# Altium footprint library PcbLib.PcbLib: 13 footprints
Each footprint in its own frame and in the unit in brackets; x right, y up, seen from the top. Pads: shape width x height; smd on the part's side, far side on the other; paste and mask are expansions set on the pad; w line width, h text height; cw(c..) or ccw(c..) is an arc to the next point about the centre after c.
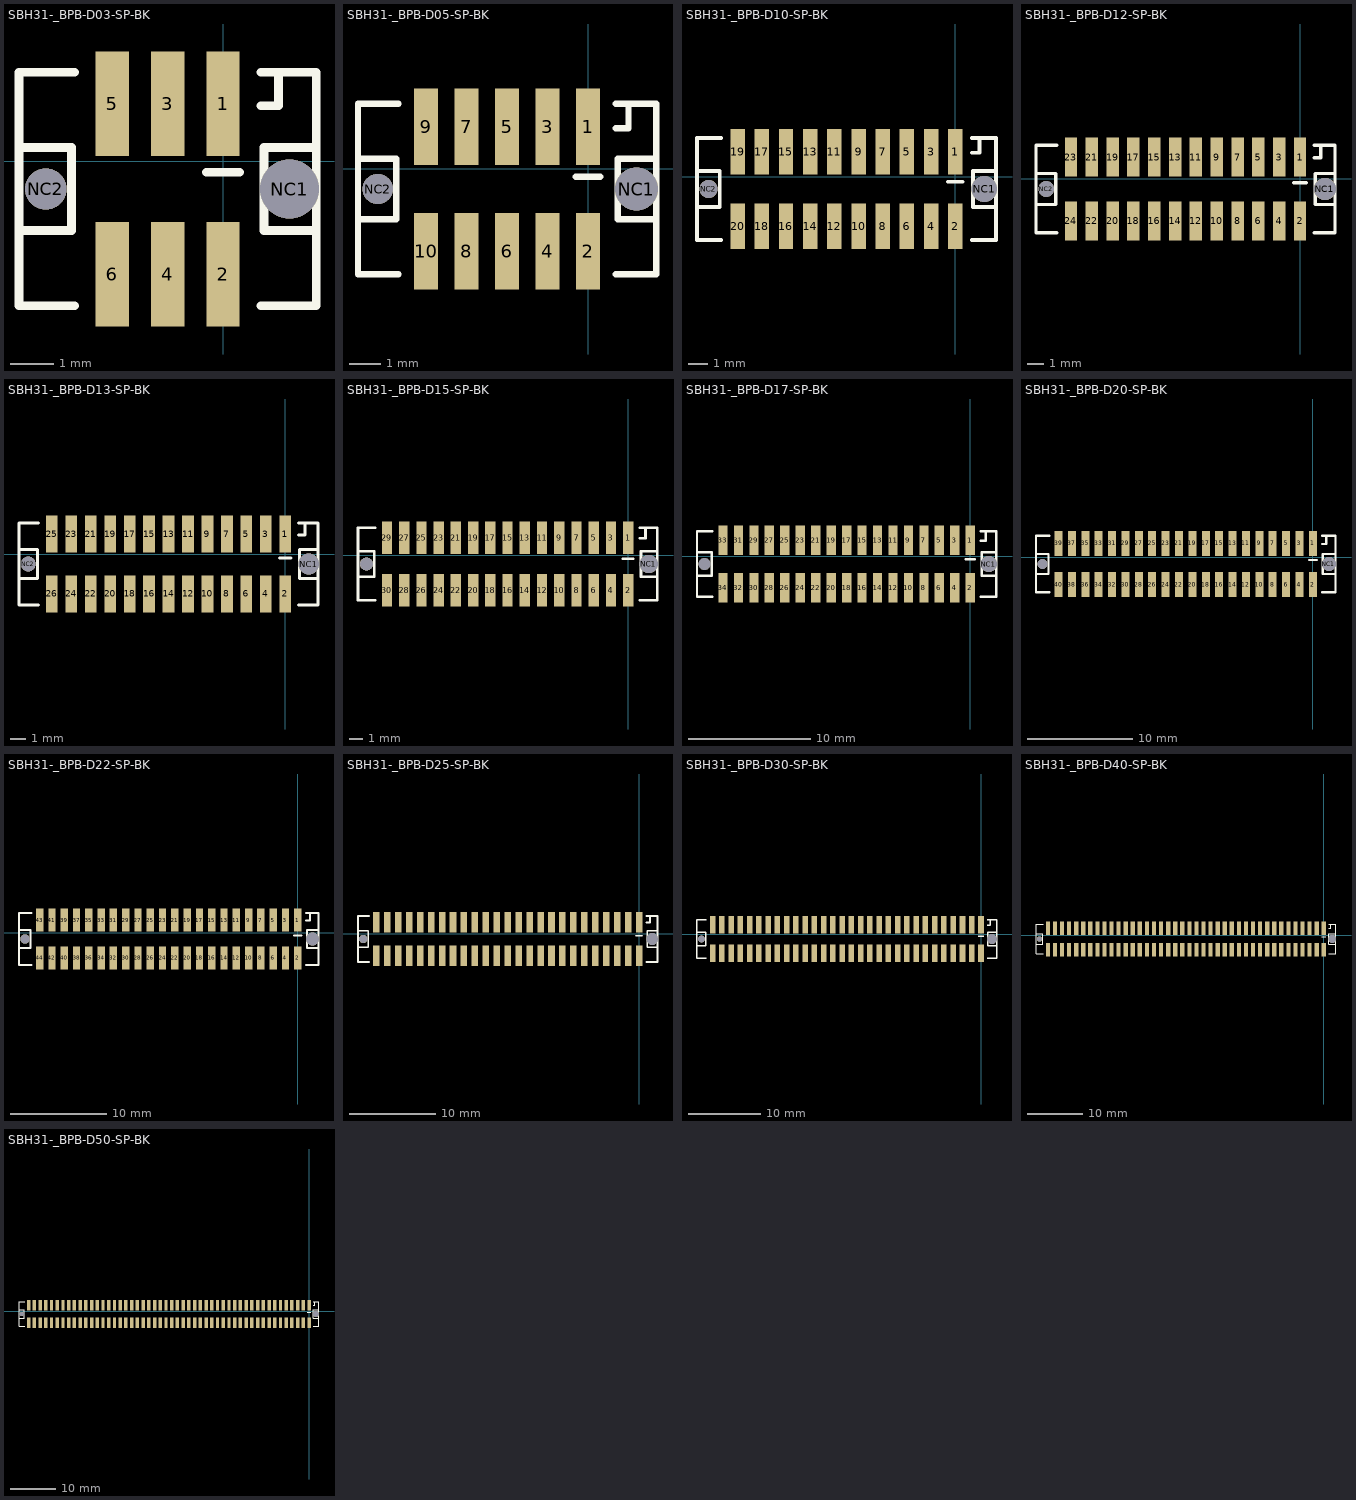
[diagram p0: the footprints below, top view; thin cyan lines are the x and y axes]

## SBH31-_BPB-D03-SP-BK [mm] "1.27mm SMT Male Header with Guide Posts & Polarizing Key"
height 5.6
pads (8):
  rect 0.76x2.4 smd: 1(0,1.315) 2(0,-2.585) 3(-1.27,1.315) 4(-1.27,-2.585) 5(-2.54,1.315) 6(-2.54,-2.585)
  round 1.35 hole 1.35 mask+0: NC1(1.52,-0.635)
  round 0.95 hole 0.95 mask+0: NC2(-4.06,-0.635)
via 1.52,-0.635 diameter 1.35 hole 1.35
via -4.06,-0.635 diameter 0.95 hole 0.95
Top Overlay:
  lines w0.2: -4.675,-1.585 -3.475,-1.585 -3.475,0.315 -4.675,0.315 ; -3.405,-3.31 -4.675,-3.31 -4.675,2.04 -3.405,2.04 ; -0.381,-0.254 0.381,-0.254 ; 0.865,-3.31 2.135,-3.31 2.135,2.04 0.865,2.04 ; 0.865,1.27 1.27,1.27 1.27,2.04 ; 2.135,-1.585 0.935,-1.585 0.935,0.315 2.135,0.315
3D body "SBH31-_ _ _B-D03-SP-_ _.STEP": height 5.54, standoff -0.85, extent -4.675,-3.385 2.135,2.115

## SBH31-_BPB-D05-SP-BK [mm] "1.27mm SMT Male Header with Guide Posts & Polarizing Key"
height 5.6
pads (12):
  rect 0.76x2.4 smd: 1(0,1.315) 2(0,-2.585) 3(-1.27,1.315) 4(-1.27,-2.585) 5(-2.54,1.315) 6(-2.54,-2.585) 7(-3.81,1.315) 8(-3.81,-2.585) 9(-5.08,1.315) 10(-5.08,-2.585)
  round 1.35 hole 1.35 mask+0: NC1(1.52,-0.635)
  round 0.95 hole 0.95 mask+0: NC2(-6.6,-0.635)
via -6.6,-0.635 diameter 0.95 hole 0.95
via 1.52,-0.635 diameter 1.35 hole 1.35
Top Overlay:
  lines w0.2: -7.215,-1.585 -6.015,-1.585 -6.015,0.315 -7.215,0.315 ; -5.945,-3.31 -7.215,-3.31 -7.215,2.04 -5.945,2.04 ; -0.381,-0.254 0.381,-0.254 ; 0.865,-3.31 2.135,-3.31 2.135,2.04 0.865,2.04 ; 0.865,1.27 1.27,1.27 1.27,2.04 ; 2.135,-1.585 0.935,-1.585 0.935,0.315 2.135,0.315

## SBH31-_BPB-D10-SP-BK [mm] "1.27mm SMT Male Header with Guide Posts & Polarizing Key"
height 5.6
pads (22):
  rect 0.76x2.4 smd: 1(0,1.315) 2(0,-2.585) 3(-1.27,1.315) 4(-1.27,-2.585) 5(-2.54,1.315) 6(-2.54,-2.585) 7(-3.81,1.315) 8(-3.81,-2.585) 9(-5.08,1.315) 10(-5.08,-2.585) 11(-6.35,1.315) 12(-6.35,-2.585) 13(-7.62,1.315) 14(-7.62,-2.585) 15(-8.89,1.315) 16(-8.89,-2.585) 17(-10.16,1.315) 18(-10.16,-2.585) 19(-11.43,1.315) 20(-11.43,-2.585)
  round 1.35 hole 1.35 mask+0: NC1(1.52,-0.635)
  round 0.95 hole 0.95 mask+0: NC2(-12.95,-0.635)
via 1.52,-0.635 diameter 1.35 hole 1.35
via -12.95,-0.635 diameter 0.95 hole 0.95
Top Overlay:
  lines w0.2: -13.565,-1.585 -12.365,-1.585 -12.365,0.315 -13.565,0.315 ; -12.295,-3.31 -13.565,-3.31 -13.565,2.04 -12.295,2.04 ; -0.381,-0.254 0.381,-0.254 ; 0.865,-3.31 2.135,-3.31 2.135,2.04 0.865,2.04 ; 0.865,1.27 1.27,1.27 1.27,2.04 ; 2.135,-1.585 0.935,-1.585 0.935,0.315 2.135,0.315

## SBH31-_BPB-D12-SP-BK [mm] "1.27mm SMT Male Header with Guide Posts & Polarizing Key"
height 5.6
pads (26):
  rect 0.76x2.4 smd: 1(0,1.315) 2(0,-2.585) 3(-1.27,1.315) 4(-1.27,-2.585) 5(-2.54,1.315) 6(-2.54,-2.585) 7(-3.81,1.315) 8(-3.81,-2.585) 9(-5.08,1.315) 10(-5.08,-2.585) 11(-6.35,1.315) 12(-6.35,-2.585) 13(-7.62,1.315) 14(-7.62,-2.585) 15(-8.89,1.315) 16(-8.89,-2.585) 17(-10.16,1.315) 18(-10.16,-2.585) 19(-11.43,1.315) 20(-11.43,-2.585) 21(-12.7,1.315) 22(-12.7,-2.585) 23(-13.97,1.315) 24(-13.97,-2.585)
  round 1.35 hole 1.35 mask+0: NC1(1.52,-0.635)
  round 0.95 hole 0.95 mask+0: NC2(-15.49,-0.635)
via 1.52,-0.635 diameter 1.35 hole 1.35
via -15.49,-0.635 diameter 0.95 hole 0.95
Top Overlay:
  lines w0.2: -16.105,-1.585 -14.905,-1.585 -14.905,0.315 -16.105,0.315 ; -14.835,-3.31 -16.105,-3.31 -16.105,2.04 -14.835,2.04 ; -0.381,-0.254 0.381,-0.254 ; 0.865,-3.31 2.135,-3.31 2.135,2.04 0.865,2.04 ; 0.865,1.27 1.27,1.27 1.27,2.04 ; 2.135,-1.585 0.935,-1.585 0.935,0.315 2.135,0.315

## SBH31-_BPB-D13-SP-BK [mm] "1.27mm SMT Male Header with Guide Posts & Polarizing Key"
height 5.6
pads (28):
  rect 0.76x2.4 smd: 1(0,1.315) 2(0,-2.585) 3(-1.27,1.315) 4(-1.27,-2.585) 5(-2.54,1.315) 6(-2.54,-2.585) 7(-3.81,1.315) 8(-3.81,-2.585) 9(-5.08,1.315) 10(-5.08,-2.585) 11(-6.35,1.315) 12(-6.35,-2.585) 13(-7.62,1.315) 14(-7.62,-2.585) 15(-8.89,1.315) 16(-8.89,-2.585) 17(-10.16,1.315) 18(-10.16,-2.585) 19(-11.43,1.315) 20(-11.43,-2.585) 21(-12.7,1.315) 22(-12.7,-2.585) 23(-13.97,1.315) 24(-13.97,-2.585) 25(-15.24,1.315) 26(-15.24,-2.585)
  round 1.35 hole 1.35 mask+0: NC1(1.52,-0.635)
  round 0.95 hole 0.95 mask+0: NC2(-16.76,-0.635)
via 1.52,-0.635 diameter 1.35 hole 1.35
via -16.76,-0.635 diameter 0.95 hole 0.95
Top Overlay:
  lines w0.2: -17.375,-1.585 -16.175,-1.585 -16.175,0.315 -17.375,0.315 ; -16.105,-3.31 -17.375,-3.31 -17.375,2.04 -16.105,2.04 ; -0.381,-0.254 0.381,-0.254 ; 0.865,-3.31 2.135,-3.31 2.135,2.04 0.865,2.04 ; 0.865,1.27 1.27,1.27 1.27,2.04 ; 2.135,-1.585 0.935,-1.585 0.935,0.315 2.135,0.315
3D body "SBH31-_ _ _B-D13-SP-_ _.STEP": height 5.54, standoff -0.86, extent -17.375,-3.385 2.135,2.115

## SBH31-_BPB-D15-SP-BK [mm] "1.27mm SMT Male Header with Guide Posts & Polarizing Key"
height 5.6
pads (32):
  rect 0.76x2.4 smd: 1(0,1.315) 2(0,-2.585) 3(-1.27,1.315) 4(-1.27,-2.585) 5(-2.54,1.315) 6(-2.54,-2.585) 7(-3.81,1.315) 8(-3.81,-2.585) 9(-5.08,1.315) 10(-5.08,-2.585) 11(-6.35,1.315) 12(-6.35,-2.585) 13(-7.62,1.315) 14(-7.62,-2.585) 15(-8.89,1.315) 16(-8.89,-2.585) 17(-10.16,1.315) 18(-10.16,-2.585) 19(-11.43,1.315) 20(-11.43,-2.585) 21(-12.7,1.315) 22(-12.7,-2.585) 23(-13.97,1.315) 24(-13.97,-2.585) 25(-15.24,1.315) 26(-15.24,-2.585) 27(-16.51,1.315) 28(-16.51,-2.585) 29(-17.78,1.315) 30(-17.78,-2.585)
  round 1.35 hole 1.35 mask+0: NC1(1.52,-0.635)
  round 0.95 hole 0.95 mask+0: NC2(-19.3,-0.635)
via 1.52,-0.635 diameter 1.35 hole 1.35
via -19.3,-0.635 diameter 0.95 hole 0.95
Top Overlay:
  lines w0.2: -19.915,-1.585 -18.715,-1.585 -18.715,0.315 -19.915,0.315 ; -18.645,-3.31 -19.915,-3.31 -19.915,2.04 -18.645,2.04 ; -0.381,-0.254 0.381,-0.254 ; 0.865,-3.31 2.135,-3.31 2.135,2.04 0.865,2.04 ; 0.865,1.27 1.27,1.27 1.27,2.04 ; 2.135,-1.585 0.935,-1.585 0.935,0.315 2.135,0.315

## SBH31-_BPB-D17-SP-BK [mm] "1.27mm SMT Male Header with Guide Posts & Polarizing Key"
height 5.6
pads (36):
  rect 0.76x2.4 smd: 1(0,1.315) 2(0,-2.585) 3(-1.27,1.315) 4(-1.27,-2.585) 5(-2.54,1.315) 6(-2.54,-2.585) 7(-3.81,1.315) 8(-3.81,-2.585) 9(-5.08,1.315) 10(-5.08,-2.585) 11(-6.35,1.315) 12(-6.35,-2.585) 13(-7.62,1.315) 14(-7.62,-2.585) 15(-8.89,1.315) 16(-8.89,-2.585) 17(-10.16,1.315) 18(-10.16,-2.585) 19(-11.43,1.315) 20(-11.43,-2.585) 21(-12.7,1.315) 22(-12.7,-2.585) 23(-13.97,1.315) 24(-13.97,-2.585) 25(-15.24,1.315) 26(-15.24,-2.585) 27(-16.51,1.315) 28(-16.51,-2.585) 29(-17.78,1.315) 30(-17.78,-2.585) 31(-19.05,1.315) 32(-19.05,-2.585) 33(-20.32,1.315) 34(-20.32,-2.585)
  round 1.35 hole 1.35 mask+0: NC1(1.52,-0.635)
  round 0.95 hole 0.95 mask+0: NC2(-21.84,-0.635)
via -21.84,-0.635 diameter 0.95 hole 0.95
via 1.52,-0.635 diameter 1.35 hole 1.35
Top Overlay:
  lines w0.2: -22.455,-1.585 -21.255,-1.585 -21.255,0.315 -22.455,0.315 ; -21.185,-3.31 -22.455,-3.31 -22.455,2.04 -21.185,2.04 ; -0.381,-0.254 0.381,-0.254 ; 0.865,-3.31 2.135,-3.31 2.135,2.04 0.865,2.04 ; 0.865,1.27 1.27,1.27 1.27,2.04 ; 2.135,-1.585 0.935,-1.585 0.935,0.315 2.135,0.315
3D body "SBH31-_ _ _B-D17-SP-_ _.STEP": height 5.54, standoff -0.86, extent -22.455,-3.385 2.135,2.115

## SBH31-_BPB-D20-SP-BK [mm] "1.27mm SMT Male Header with Guide Posts & Polarizing Key"
height 5.6
pads (42):
  rect 0.76x2.4 smd: 1(0,1.315) 2(0,-2.585) 3(-1.27,1.315) 4(-1.27,-2.585) 5(-2.54,1.315) 6(-2.54,-2.585) 7(-3.81,1.315) 8(-3.81,-2.585) 9(-5.08,1.315) 10(-5.08,-2.585) 11(-6.35,1.315) 12(-6.35,-2.585) 13(-7.62,1.315) 14(-7.62,-2.585) 15(-8.89,1.315) 16(-8.89,-2.585) 17(-10.16,1.315) 18(-10.16,-2.585) 19(-11.43,1.315) 20(-11.43,-2.585) 21(-12.7,1.315) 22(-12.7,-2.585) 23(-13.97,1.315) 24(-13.97,-2.585) 25(-15.24,1.315) 26(-15.24,-2.585) 27(-16.51,1.315) 28(-16.51,-2.585) 29(-17.78,1.315) 30(-17.78,-2.585) 31(-19.05,1.315) 32(-19.05,-2.585) 33(-20.32,1.315) 34(-20.32,-2.585) 35(-21.59,1.315) 36(-21.59,-2.585) 37(-22.86,1.315) 38(-22.86,-2.585) 39(-24.13,1.315) 40(-24.13,-2.585)
  round 1.35 hole 1.35 mask+0: NC1(1.52,-0.635)
  round 0.95 hole 0.95 mask+0: NC2(-25.65,-0.635)
via 1.52,-0.635 diameter 1.35 hole 1.35
via -25.65,-0.635 diameter 0.95 hole 0.95
Top Overlay:
  lines w0.2: -26.265,-1.585 -25.065,-1.585 -25.065,0.315 -26.265,0.315 ; -24.995,-3.31 -26.265,-3.31 -26.265,2.04 -24.995,2.04 ; -0.381,-0.254 0.381,-0.254 ; 0.865,-3.31 2.135,-3.31 2.135,2.04 0.865,2.04 ; 0.865,1.27 1.27,1.27 1.27,2.04 ; 2.135,-1.585 0.935,-1.585 0.935,0.315 2.135,0.315

## SBH31-_BPB-D22-SP-BK [mm] "1.27mm SMT Male Header with Guide Posts & Polarizing Key"
height 5.6
pads (46):
  rect 0.76x2.4 smd: 1(0,1.315) 2(0,-2.585) 3(-1.27,1.315) 4(-1.27,-2.585) 5(-2.54,1.315) 6(-2.54,-2.585) 7(-3.81,1.315) 8(-3.81,-2.585) 9(-5.08,1.315) 10(-5.08,-2.585) 11(-6.35,1.315) 12(-6.35,-2.585) 13(-7.62,1.315) 14(-7.62,-2.585) 15(-8.89,1.315) 16(-8.89,-2.585) 17(-10.16,1.315) 18(-10.16,-2.585) 19(-11.43,1.315) 20(-11.43,-2.585) 21(-12.7,1.315) 22(-12.7,-2.585) 23(-13.97,1.315) 24(-13.97,-2.585) 25(-15.24,1.315) 26(-15.24,-2.585) 27(-16.51,1.315) 28(-16.51,-2.585) 29(-17.78,1.315) 30(-17.78,-2.585) 31(-19.05,1.315) 32(-19.05,-2.585) 33(-20.32,1.315) 34(-20.32,-2.585) 35(-21.59,1.315) 36(-21.59,-2.585) 37(-22.86,1.315) 38(-22.86,-2.585) 39(-24.13,1.315) 40(-24.13,-2.585) 41(-25.4,1.315) 42(-25.4,-2.585) 43(-26.67,1.315) 44(-26.67,-2.585)
  round 1.35 hole 1.35 mask+0: NC1(1.52,-0.635)
  round 0.95 hole 0.95 mask+0: NC2(-28.19,-0.635)
via 1.52,-0.635 diameter 1.35 hole 1.35
via -28.19,-0.635 diameter 0.95 hole 0.95
Top Overlay:
  lines w0.2: -28.805,-1.585 -27.605,-1.585 -27.605,0.315 -28.805,0.315 ; -27.535,-3.31 -28.805,-3.31 -28.805,2.04 -27.535,2.04 ; -0.381,-0.254 0.381,-0.254 ; 0.865,-3.31 2.135,-3.31 2.135,2.04 0.865,2.04 ; 0.865,1.27 1.27,1.27 1.27,2.04 ; 2.135,-1.585 0.935,-1.585 0.935,0.315 2.135,0.315

## SBH31-_BPB-D25-SP-BK [mm] "1.27mm SMT Male Header with Guide Posts & Polarizing Key"
height 5.6
pads (52):
  rect 0.76x2.4 smd: 1(0,1.315) 2(0,-2.585) 3(-1.27,1.315) 4(-1.27,-2.585) 5(-2.54,1.315) 6(-2.54,-2.585) 7(-3.81,1.315) 8(-3.81,-2.585) 9(-5.08,1.315) 10(-5.08,-2.585) 11(-6.35,1.315) 12(-6.35,-2.585) 13(-7.62,1.315) 14(-7.62,-2.585) 15(-8.89,1.315) 16(-8.89,-2.585) 17(-10.16,1.315) 18(-10.16,-2.585) 19(-11.43,1.315) 20(-11.43,-2.585) 21(-12.7,1.315) 22(-12.7,-2.585) 23(-13.97,1.315) 24(-13.97,-2.585) 25(-15.24,1.315) 26(-15.24,-2.585) 27(-16.51,1.315) 28(-16.51,-2.585) 29(-17.78,1.315) 30(-17.78,-2.585) 31(-19.05,1.315) 32(-19.05,-2.585) 33(-20.32,1.315) 34(-20.32,-2.585) 35(-21.59,1.315) 36(-21.59,-2.585) 37(-22.86,1.315) 38(-22.86,-2.585) 39(-24.13,1.315) 40(-24.13,-2.585) 41(-25.4,1.315) 42(-25.4,-2.585) 43(-26.67,1.315) 44(-26.67,-2.585) 45(-27.94,1.315) 46(-27.94,-2.585) 47(-29.21,1.315) 48(-29.21,-2.585) 49(-30.48,1.315) 50(-30.48,-2.585)
  round 1.35 hole 1.35 mask+0: NC1(1.52,-0.635)
  round 0.95 hole 0.95 mask+0: NC2(-32,-0.635)
via 1.52,-0.635 diameter 1.35 hole 1.35
via -32,-0.635 diameter 0.95 hole 0.95
Top Overlay:
  lines w0.2: -32.615,-1.585 -31.415,-1.585 -31.415,0.315 -32.615,0.315 ; -31.345,-3.31 -32.615,-3.31 -32.615,2.04 -31.345,2.04 ; -0.381,-0.254 0.381,-0.254 ; 0.865,-3.31 2.135,-3.31 2.135,2.04 0.865,2.04 ; 0.865,1.27 1.27,1.27 1.27,2.04 ; 2.135,-1.585 0.935,-1.585 0.935,0.315 2.135,0.315

## SBH31-_BPB-D30-SP-BK [mm] "1.27mm SMT Male Header with Guide Posts & Polarizing Key"
height 5.6
pads (62):
  rect 0.76x2.4 smd: 1(0,1.315) 2(0,-2.585) 3(-1.27,1.315) 4(-1.27,-2.585) 5(-2.54,1.315) 6(-2.54,-2.585) 7(-3.81,1.315) 8(-3.81,-2.585) 9(-5.08,1.315) 10(-5.08,-2.585) 11(-6.35,1.315) 12(-6.35,-2.585) 13(-7.62,1.315) 14(-7.62,-2.585) 15(-8.89,1.315) 16(-8.89,-2.585) 17(-10.16,1.315) 18(-10.16,-2.585) 19(-11.43,1.315) 20(-11.43,-2.585) 21(-12.7,1.315) 22(-12.7,-2.585) 23(-13.97,1.315) 24(-13.97,-2.585) 25(-15.24,1.315) 26(-15.24,-2.585) 27(-16.51,1.315) 28(-16.51,-2.585) 29(-17.78,1.315) 30(-17.78,-2.585) 31(-19.05,1.315) 32(-19.05,-2.585) 33(-20.32,1.315) 34(-20.32,-2.585) 35(-21.59,1.315) 36(-21.59,-2.585) 37(-22.86,1.315) 38(-22.86,-2.585) 39(-24.13,1.315) 40(-24.13,-2.585) 41(-25.4,1.315) 42(-25.4,-2.585) 43(-26.67,1.315) 44(-26.67,-2.585) 45(-27.94,1.315) 46(-27.94,-2.585) 47(-29.21,1.315) 48(-29.21,-2.585) 49(-30.48,1.315) 50(-30.48,-2.585) 51(-31.75,1.315) 52(-31.75,-2.585) 53(-33.02,1.315) 54(-33.02,-2.585) 55(-34.29,1.315) 56(-34.29,-2.585) 57(-35.56,1.315) 58(-35.56,-2.585) 59(-36.83,1.315) 60(-36.83,-2.585)
  round 1.35 hole 1.35 mask+0: NC1(1.52,-0.635)
  round 0.95 hole 0.95 mask+0: NC2(-38.35,-0.635)
via 1.52,-0.635 diameter 1.35 hole 1.35
via -38.35,-0.635 diameter 0.95 hole 0.95
Top Overlay:
  lines w0.2: -38.965,-1.585 -37.765,-1.585 -37.765,0.315 -38.965,0.315 ; -37.695,-3.31 -38.965,-3.31 -38.965,2.04 -37.695,2.04 ; -0.381,-0.254 0.381,-0.254 ; 0.865,-3.31 2.135,-3.31 2.135,2.04 0.865,2.04 ; 0.865,1.27 1.27,1.27 1.27,2.04 ; 2.135,-1.585 0.935,-1.585 0.935,0.315 2.135,0.315

## SBH31-_BPB-D40-SP-BK [mm] "1.27mm SMT Male Header with Guide Posts & Polarizing Key"
height 5.6
pads (82):
  rect 0.76x2.4 smd: 1(0,1.315) 2(0,-2.585) 3(-1.27,1.315) 4(-1.27,-2.585) 5(-2.54,1.315) 6(-2.54,-2.585) 7(-3.81,1.315) 8(-3.81,-2.585) 9(-5.08,1.315) 10(-5.08,-2.585) 11(-6.35,1.315) 12(-6.35,-2.585) 13(-7.62,1.315) 14(-7.62,-2.585) 15(-8.89,1.315) 16(-8.89,-2.585) 17(-10.16,1.315) 18(-10.16,-2.585) 19(-11.43,1.315) 20(-11.43,-2.585) 21(-12.7,1.315) 22(-12.7,-2.585) 23(-13.97,1.315) 24(-13.97,-2.585) 25(-15.24,1.315) 26(-15.24,-2.585) 27(-16.51,1.315) 28(-16.51,-2.585) 29(-17.78,1.315) 30(-17.78,-2.585) 31(-19.05,1.315) 32(-19.05,-2.585) 33(-20.32,1.315) 34(-20.32,-2.585) 35(-21.59,1.315) 36(-21.59,-2.585) 37(-22.86,1.315) 38(-22.86,-2.585) 39(-24.13,1.315) 40(-24.13,-2.585) 41(-25.4,1.315) 42(-25.4,-2.585) 43(-26.67,1.315) 44(-26.67,-2.585) 45(-27.94,1.315) 46(-27.94,-2.585) 47(-29.21,1.315) 48(-29.21,-2.585) 49(-30.48,1.315) 50(-30.48,-2.585) 51(-31.75,1.315) 52(-31.75,-2.585) 53(-33.02,1.315) 54(-33.02,-2.585) 55(-34.29,1.315) 56(-34.29,-2.585) 57(-35.56,1.315) 58(-35.56,-2.585) 59(-36.83,1.315) 60(-36.83,-2.585) 61(-38.1,1.315) 62(-38.1,-2.585) 63(-39.37,1.315) 64(-39.37,-2.585) 65(-40.64,1.315) 66(-40.64,-2.585) 67(-41.91,1.315) 68(-41.91,-2.585) 69(-43.18,1.315) 70(-43.18,-2.585) 71(-44.45,1.315) 72(-44.45,-2.585) 73(-45.72,1.315) 74(-45.72,-2.585) 75(-46.99,1.315) 76(-46.99,-2.585) 77(-48.26,1.315) 78(-48.26,-2.585) 79(-49.53,1.315) 80(-49.53,-2.585)
  round 1.35 hole 1.35 mask+0: NC1(1.52,-0.635)
  round 0.95 hole 0.95 mask+0: NC2(-51.05,-0.635)
via 1.52,-0.635 diameter 1.35 hole 1.35
via -51.05,-0.635 diameter 0.95 hole 0.95
Top Overlay:
  lines w0.2: -51.665,-1.585 -50.465,-1.585 -50.465,0.315 -51.665,0.315 ; -50.395,-3.31 -51.665,-3.31 -51.665,2.04 -50.395,2.04 ; -0.381,-0.254 0.381,-0.254 ; 0.865,-3.31 2.135,-3.31 2.135,2.04 0.865,2.04 ; 0.865,1.27 1.27,1.27 1.27,2.04 ; 2.135,-1.585 0.935,-1.585 0.935,0.315 2.135,0.315

## SBH31-_BPB-D50-SP-BK [mm] "1.27mm SMT Male Header with Guide Posts & Polarizing Key"
height 5.6
pads (102):
  rect 0.76x2.4 smd: 1(0,1.315) 2(0,-2.585) 3(-1.27,1.315) 4(-1.27,-2.585) 5(-2.54,1.315) 6(-2.54,-2.585) 7(-3.81,1.315) 8(-3.81,-2.585) 9(-5.08,1.315) 10(-5.08,-2.585) 11(-6.35,1.315) 12(-6.35,-2.585) 13(-7.62,1.315) 14(-7.62,-2.585) 15(-8.89,1.315) 16(-8.89,-2.585) 17(-10.16,1.315) 18(-10.16,-2.585) 19(-11.43,1.315) 20(-11.43,-2.585) 21(-12.7,1.315) 22(-12.7,-2.585) 23(-13.97,1.315) 24(-13.97,-2.585) 25(-15.24,1.315) 26(-15.24,-2.585) 27(-16.51,1.315) 28(-16.51,-2.585) 29(-17.78,1.315) 30(-17.78,-2.585) 31(-19.05,1.315) 32(-19.05,-2.585) 33(-20.32,1.315) 34(-20.32,-2.585) 35(-21.59,1.315) 36(-21.59,-2.585) 37(-22.86,1.315) 38(-22.86,-2.585) 39(-24.13,1.315) 40(-24.13,-2.585) 41(-25.4,1.315) 42(-25.4,-2.585) 43(-26.67,1.315) 44(-26.67,-2.585) 45(-27.94,1.315) 46(-27.94,-2.585) 47(-29.21,1.315) 48(-29.21,-2.585) 49(-30.48,1.315) 50(-30.48,-2.585) 51(-31.75,1.315) 52(-31.75,-2.585) 53(-33.02,1.315) 54(-33.02,-2.585) 55(-34.29,1.315) 56(-34.29,-2.585) 57(-35.56,1.315) 58(-35.56,-2.585) 59(-36.83,1.315) 60(-36.83,-2.585) 61(-38.1,1.315) 62(-38.1,-2.585) 63(-39.37,1.315) 64(-39.37,-2.585) 65(-40.64,1.315) 66(-40.64,-2.585) 67(-41.91,1.315) 68(-41.91,-2.585) 69(-43.18,1.315) 70(-43.18,-2.585) 71(-44.45,1.315) 72(-44.45,-2.585) 73(-45.72,1.315) 74(-45.72,-2.585) 75(-46.99,1.315) 76(-46.99,-2.585) 77(-48.26,1.315) 78(-48.26,-2.585) 79(-49.53,1.315) 80(-49.53,-2.585) 81(-50.8,1.315) 82(-50.8,-2.585) 83(-52.07,1.315) 84(-52.07,-2.585) 85(-53.34,1.315) 86(-53.34,-2.585) 87(-54.61,1.315) 88(-54.61,-2.585) 89(-55.88,1.315) 90(-55.88,-2.585) 91(-57.15,1.315) 92(-57.15,-2.585) 93(-58.42,1.315) 94(-58.42,-2.585) 95(-59.69,1.315) 96(-59.69,-2.585) 97(-60.96,1.315) 98(-60.96,-2.585) 99(-62.23,1.315) 100(-62.23,-2.585)
  round 1.35 hole 1.35 mask+0: NC1(1.52,-0.635)
  round 0.95 hole 0.95 mask+0: NC2(-63.75,-0.635)
via 1.52,-0.635 diameter 1.35 hole 1.35
via -63.75,-0.635 diameter 0.95 hole 0.95
Top Overlay:
  lines w0.2: -64.365,-1.585 -63.165,-1.585 -63.165,0.315 -64.365,0.315 ; -63.095,-3.31 -64.365,-3.31 -64.365,2.04 -63.095,2.04 ; -0.381,-0.254 0.381,-0.254 ; 0.865,-3.31 2.135,-3.31 2.135,2.04 0.865,2.04 ; 0.865,1.27 1.27,1.27 1.27,2.04 ; 2.135,-1.585 0.935,-1.585 0.935,0.315 2.135,0.315
3D body "SBH31-_ _ _B-D50-SP-_ _.STEP": height 5.54, standoff -0.86, extent -64.365,-3.385 2.135,2.115